# Altium footprint library mfmc_footprints.PcbLib: 156 footprints (part 9 of 10)
Each footprint in its own frame and in the unit in brackets; x right, y up, seen from the top. Pads: shape width x height; smd on the part's side, far side on the other; paste and mask are expansions set on the pad; w line width, h text height; cw(c..) or ccw(c..) is an arc to the next point about the centre after c.
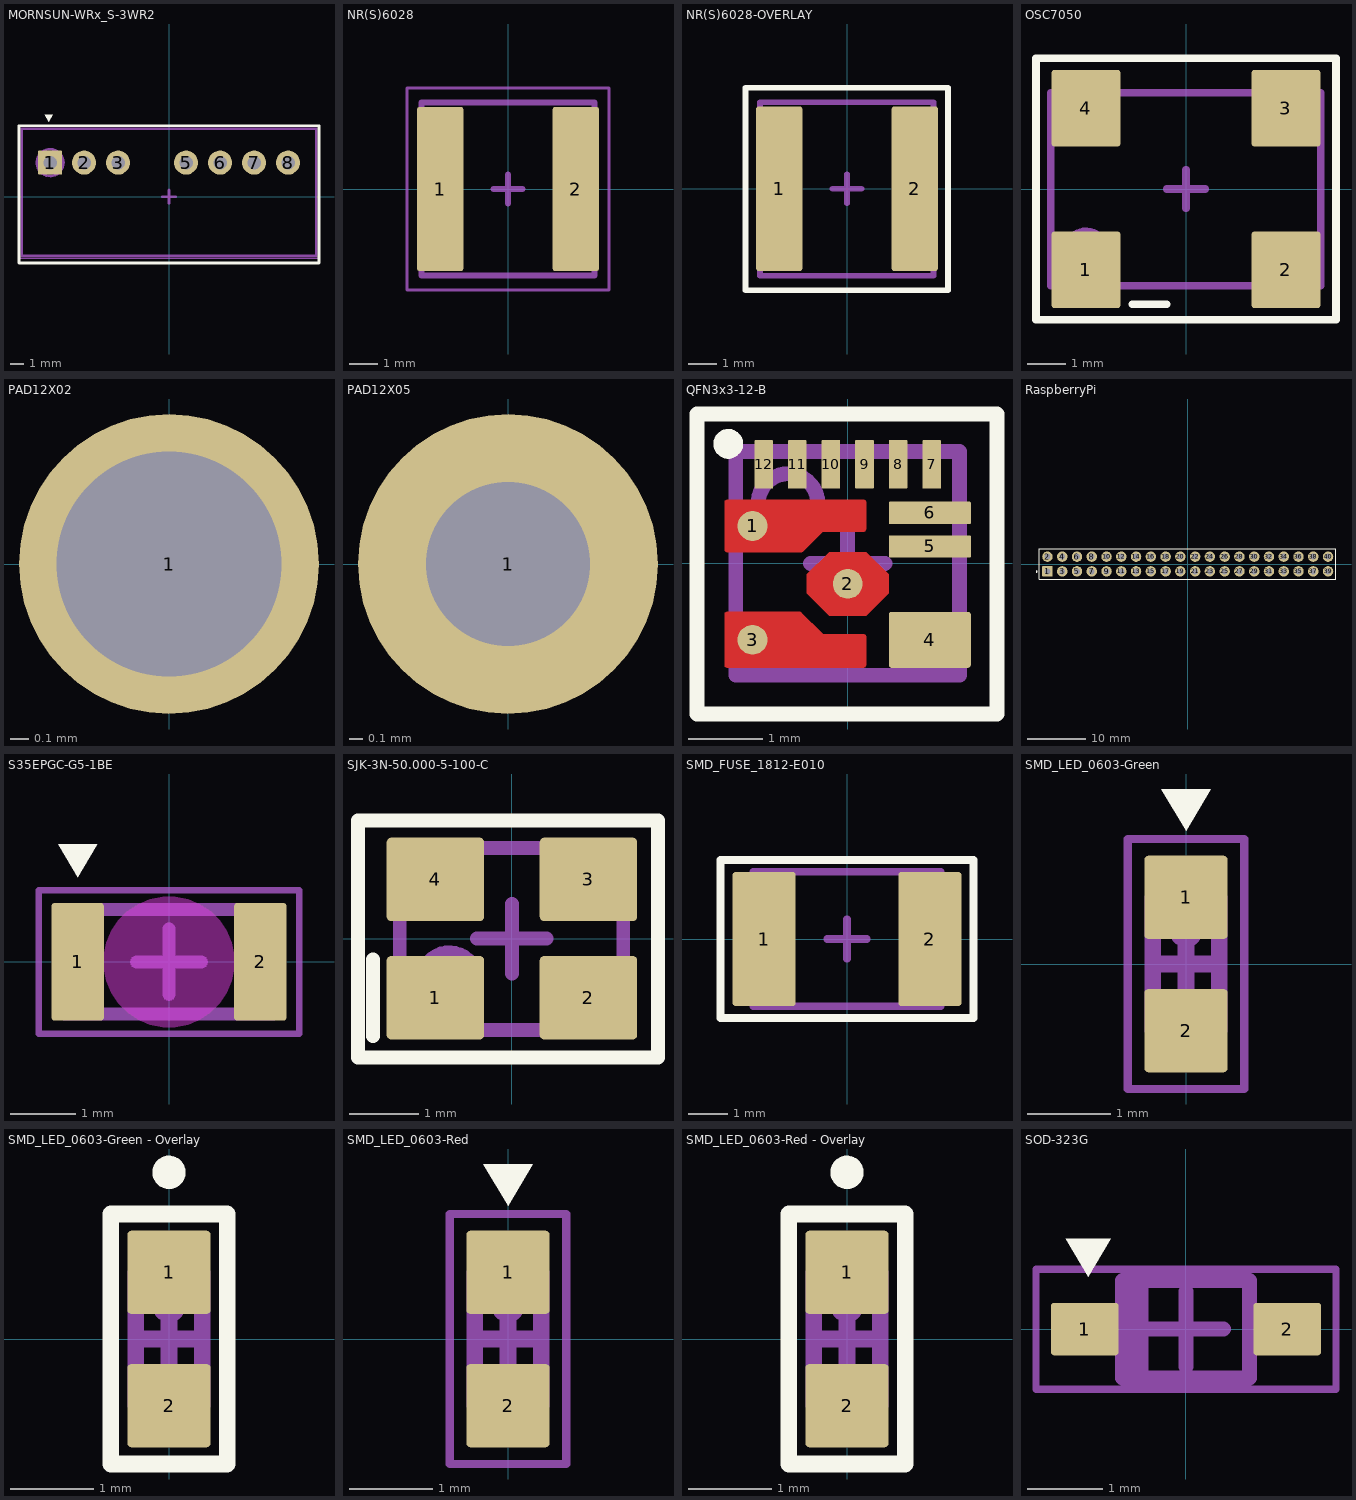
[diagram p8: the footprints below, top view; thin cyan lines are the x and y axes]

## MORNSUN-WRx_S-3WR2 [mm] "DC/DC Converter WRA_S-3WR2 & WRB_S-3WR2 Series"
height 12
pads (7):
  rrect10% 1.8x1.8 hole 1: 1(-8.89,2.54)
  round 1.8 hole 1: 2(-6.35,2.54) 3(-3.81,2.54) 5(1.27,2.54) 6(3.81,2.54) 7(6.35,2.54) 8(8.89,2.54)
Top Overlay:
  region: -9,5.6 -9.3,6.1 -9.2,6.1 -8.7,6.1
  lines w0.2: -11.213,-4.963 11.2,-4.963 11.2,5.3 -11.213,5.3 -11.213,-4.963
Top Courtyard:
  lines w0.1: -11.2,-4.6 -11.2,5.3 11.2,5.3 11.2,-4.6 -11.2,-4.6
  lines w0.2: -0.5,0 0.5,0 ; 0,-0.5 0,0.5
Top Assembly:
  circle w0.2: c-8.89,2.54 r1
  lines w0.2: -11,-4.42 -11,5.08 11,5.08 11,-4.42 -11,-4.42
Top Designator (Mech10):
  text ".Designator" at -7.624,0.011 h1.52
3D body "User Library-User Library-Power suply MORNSUN WRAxxxxS-3WR2.STEP": height 12, standoff -3.5, extent -11,-4.47 11,5.04

## NR(S)6028 [mm] "TAIYO YUDEN SMD POWER INDUCTORS 6x6x2.8mm"
height 2.8
pads (2):
  rrect10% 1.6x5.7 smd: 1(-2.35,0) 2(2.35,0)
Top Courtyard:
  lines w0.1: -3.5,-3.5 3.5,-3.5 3.5,3.5 -3.5,3.5 -3.5,-3.5
  lines w0.2: -0.5,0 0.5,0 ; 0,-0.5 0,0.5
Top Assembly:
  lines w0.2: -3,-3 3,-3 3,3 -3,3 -3,-3
Top Designator (Mech10):
  text ".Designator" at -7.618,-0.508 h1.52
3D body "User Library-NR6028T150M.step": height 2.81, standoff -0.05, extent -3,-3 3,3

## NR(S)6028-OVERLAY [mm] "TAIYO YUDEN SMD POWER INDUCTORS 6x6x2.8mm"
height 2.8
pads (2):
  rrect10% 1.6x5.7 smd: 1(-2.35,0) 2(2.35,0)
Top Overlay:
  lines w0.2: -3.519,-3.519 3.5,-3.519 3.5,3.5 -3.519,3.5 -3.519,-3.519
Top Courtyard:
  lines w0.1: -3.519,-3.519 3.5,-3.519 3.5,3.5 -3.519,3.5 -3.519,-3.519
  lines w0.2: -0.5,0 0.5,0 ; 0,-0.5 0,0.5
Top Assembly:
  lines w0.2: -3.019,-3.019 3,-3.019 3,3 -3.019,3 -3.019,-3.019
Top Designator (Mech10):
  text ".Designator" at -7.627,-0.517 h1.52
3D body "User Library-NR6028T150M.step": height 2.81, standoff -0.05, extent -3,-3 3,3

## OSC7050 [mm]
height 1.4
pads (4):
  rrect10% 1.8x2 smd: 1(-2.6,-2.1) 2(2.6,-2.1) 3(2.6,2.1) 4(-2.6,2.1)
Top Overlay:
  lines w0.2: -1.4,-3 -0.5,-3 ; -3.9,-3.4 -3.9,3.4 3.9,3.4 3.9,-3.4 -3.9,-3.4
Top Courtyard:
  lines w0.1: -3.9,-3.4 3.9,-3.4 3.9,3.4 -3.9,3.4 -3.9,-3.4
  lines w0.2: -0.5,0 0.5,0 ; 0,-0.5 0,0.5
Top Assembly:
  circle w0.2: c-2.6,-1.6 r0.5
  lines w0.2: -3.513,-2.513 3.5,-2.513 3.5,2.5 -3.513,2.5 -3.513,-2.513
Top Designator (Mech10):
  text ".Designator" at -7.618,-0.508 h1.52
3D body "OSC7050.STEP": height 1.4, standoff 0, extent -3.6,-2.6 3.6,2.6

## PAD12X02 [mm] "Pad -Hole = 1.2mm -Annular Ring = 0.2mm"
pads (1):
  round 1.6 hole 1.2: 1(0,0)
Top Designator (Mech10):
  text ".Designator" at -7.618,-0.508 h1.52

## PAD12X05 [mm] "Pad -Hole = 1.2mm -Annular Ring = 0.5mm"
pads (1):
  round 2.2 hole 1.2: 1(0,0)
Top Designator (Mech10):
  text ".Designator" at -7.618,-0.508 h1.52

## QFN3x3-12-B [mm]
height 0.9
pads (12):
  round 0.4 smd mask+0.04: 1(-1.275,0.5) 2(0,-0.275) 3(-1.275,-1.025)
  rrect10% 1.1x0.75 smd mask+0.04: 4(1.1,-1.025)
  rrect10% 1.1x0.3 smd mask+0.04: 5(1.1,0.225) 6(1.1,0.675)
  rrect10% 0.25x0.65 smd mask+0.04: 7(1.125,1.325) 8(0.675,1.325) 9(0.225,1.325) 10(-0.225,1.325) 11(-0.675,1.325) 12(-1.125,1.325)
Top Layer:
  region: -1.65,-0.685 -1.65,-1.365 -1.65,-1.372 -1.645,-1.385 -1.635,-1.395 -1.622,-1.4 -1.615,-1.4 0.21,-1.4 0.218,-1.4 0.233,-1.394 0.244,-1.383 0.25,-1.368 0.25,-1.36 0.25,-0.985 0.25,-0.978 0.245,-0.965 0.235,-0.955 0.222,-0.95 0.215,-0.95 -0.315,-0.95 -0.319,-0.95 -0.325,-0.948 -0.332,-0.946 -0.338,-0.942 -0.341,-0.939 -0.619,-0.661 -0.622,-0.658 -0.628,-0.654 -0.634,-0.651 -0.641,-0.65 -0.645,-0.65 -1.615,-0.65 -1.622,-0.65 -1.635,-0.655 -1.645,-0.665 -1.65,-0.678
  region: -1.65,0.185 -1.65,0.815 -1.65,0.822 -1.645,0.835 -1.635,0.845 -1.622,0.85 -1.615,0.85 0.215,0.85 0.222,0.85 0.235,0.845 0.245,0.835 0.25,0.822 0.25,0.815 0.25,0.46 0.25,0.453 0.245,0.44 0.235,0.43 0.222,0.425 0.215,0.425 -0.315,0.425 -0.319,0.425 -0.326,0.423 -0.332,0.421 -0.338,0.417 -0.341,0.414 -0.594,0.161 -0.597,0.158 -0.603,0.154 -0.609,0.151 -0.616,0.15 -0.62,0.15 -1.615,0.15 -1.622,0.15 -1.635,0.155 -1.645,0.165 -1.65,0.178
  region: -0.55,-0.15 -0.25,0.15 0.25,0.15 0.55,-0.15 0.55,-0.4 0.25,-0.699 -0.25,-0.699 -0.55,-0.4
Top Overlay:
  circle w0.2: c-1.6,1.6 r0.1
  lines w0.2: -2.019,-2.019 2,-2.019 2,2 -2.019,2 -2.019,-2.019
Top Courtyard:
  lines w0.1: -1.5,-1.5 -1.5,1.5 1.5,1.5 1.5,-1.5 -1.5,-1.5
  lines w0.2: -0.5,0 0.5,0 ; 0,-0.5 0,0.5
Top Assembly:
  circle w0.2: c-0.8,0.8 r0.4
  lines w0.2: -1.5,-1.5 -1.5,1.5 1.5,1.5 1.5,-1.5 -1.5,-1.5
Top Designator (Mech10):
  text ".Designator" at -7.627,-0.517 h1.52
3D body "SY8368A.STEP": height 0.95, standoff 0, extent -1.55,-1.5 1.55,1.55

## RaspberryPi [mm]
pads (40):
  rrect10% 1.8x1.8 hole 1.02: 1(-24.13,-1.27)
  round 1.8 hole 1.02: 2(-24.13,1.27) 3(-21.59,-1.27) 4(-21.59,1.27) 5(-19.05,-1.27) 6(-19.05,1.27) 7(-16.51,-1.27) 8(-16.51,1.27) 9(-13.97,-1.27) 10(-13.97,1.27) 11(-11.43,-1.27) 12(-11.43,1.27) 13(-8.89,-1.27) 14(-8.89,1.27) 15(-6.35,-1.27) 16(-6.35,1.27) 17(-3.81,-1.27) 18(-3.81,1.27) 19(-1.27,-1.27) 20(-1.27,1.27) 21(1.27,-1.27) 22(1.27,1.27) 23(3.81,-1.27) 24(3.81,1.27) 25(6.35,-1.27) 26(6.35,1.27) 27(8.89,-1.27) 28(8.89,1.27) 29(11.43,-1.27) 30(11.43,1.27) 31(13.97,-1.27) 32(13.97,1.27) 33(16.51,-1.27) 34(16.51,1.27) 35(19.05,-1.27) 36(19.05,1.27) 37(21.59,-1.27) 38(21.59,1.27) 39(24.13,-1.27) 40(24.13,1.27)
Top Overlay:
  circle w0.2: c-26,-1.3 r0.1
  lines w0.2: -25.5,-2.6 25.5,-2.6 25.5,2.6 -25.5,2.6 -25.5,-2.6
Top Designator (Mech10):
  text ".Designator" at 2.436,-25.485 h1.52
3D body "Raspberry Pi 3.STEP": height 15.49, standoff -3.1, extent -34.764,-53.633 54.872,3.678

## S35EPGC-G5-1BE [mm] "Reverse Package Chip LED Indicator"
height 0.3
pads (2):
  rrect10% 0.8x1.8 smd: 1(-1.4,0) 2(1.4,0)
Top Overlay:
  region: -1.7,1.8 -1.4,1.3 -1.1,1.8
Keep-Out Layer:
  board cut-out: 0,-1 -0.098,-1 -0.292,-0.962 -0.474,-0.886 -0.637,-0.777 -0.777,-0.637 -0.886,-0.474 -0.962,-0.292 -1,-0.098 -1,0 -1,0.098 -0.962,0.292 -0.886,0.474 -0.777,0.637 -0.637,0.777 -0.474,0.886 -0.292,0.962 -0.098,1 0,1 0.098,1 0.292,0.962 0.474,0.886 0.637,0.777 0.777,0.637 0.886,0.474 0.962,0.292 1,0.098 1,0 1,-0.098 0.962,-0.292 0.886,-0.474 0.777,-0.637 0.637,-0.777 0.474,-0.886 0.292,-0.962 0.098,-1
Top Courtyard:
  lines w0.1: -2,-1.1 2,-1.1 2,1.1 -2,1.1 -2,-1.1
  lines w0.2: -0.5,0 0.5,0 ; 0,-0.5 0,0.5
Top Assembly:
  rectangle: -1.6,-0.8 -1.2,0.8
  lines w0.2: -1.6,-0.8 1.6,-0.8 1.6,0.8 -1.6,0.8 -1.6,-0.8
Top Designator (Mech10):
  text ".Designator" at -7.618,-0.183 h1.52

## SJK-3N-50.000-5-100-C [mm]
height 1
pads (4):
  rrect10% 1.4x1.2 smd: 1(-1.1,-0.85) 2(1.1,-0.85) 3(1.1,0.85) 4(-1.1,0.85)
Top Overlay:
  lines w0.2: -2,-1.4 -2,-0.3 ; -2.213,-1.713 2.1,-1.713 2.1,1.7 -2.213,1.7 -2.213,-1.713
Top Courtyard:
  lines w0.1: -2.213,-1.713 2.1,-1.713 2.1,1.7 -2.213,1.7 -2.213,-1.713
  lines w0.2: -0.5,0 0.5,0 ; 0,-0.5 0,0.5
Top Assembly:
  circle w0.2: c-0.9,-0.6 r0.4
  lines w0.2: -1.613,-1.313 1.6,-1.313 1.6,1.3 -1.613,1.3 -1.613,-1.313
Top Designator (Mech10):
  text ".Designator" at -7.674,-0.514 h1.52
3D body "User Library-Ecsxtal__ECS-3225MV__Body3_2x2_5__H1_2.step": height 1, standoff 0, extent -1.6,-1.25 1.6,1.25

## SMD_FUSE_1812-E010 [mm]
height 0.9
pads (2):
  rrect10% 1.6x3.4 smd: 1(-2.1,0) 2(2.1,0)
Top Overlay:
  lines w0.2: -3.2,-2 3.2,-2 3.2,2 -3.2,2 -3.2,-2
Top Courtyard:
  lines w0.1: -3.2,-2 -3.2,2 3.2,2 3.2,-2 -3.2,-2
  lines w0.2: -0.5,0 0.5,0 ; 0,-0.5 0,0.5
Top Assembly:
  lines w0.2: -2.365,-1.705 2.365,-1.705 2.365,1.705 -2.365,1.705 -2.365,-1.705
Top Designator (Mech10):
  text ".Designator" at -7.618,-0.508 h1.52
3D body "SR1812-Body.STEP": height 0.9, standoff 0, extent -2.25,-1.6 2.25,1.6

## SMD_LED_0603-Green [mm]
pads (2):
  rrect10% 1x1 smd: 1(0,0.8) 2(0,-0.8)
Top Overlay:
  region: 0,1.6 -0.3,2.1 0.3,2.1
Top Courtyard:
  lines w0.1: -0.7,-1.5 0.7,-1.5 0.7,1.5 -0.7,1.5 -0.7,-1.5
  lines w0.2: -0.3,0 0.3,0 ; 0,-0.3 0,0.3
Top Assembly:
  circle w0.2: c0,0.4 r0.1
  lines w0.2: -0.4,-0.8 0.4,-0.8 0.4,0.8 -0.4,0.8 -0.4,-0.8
Top Designator (Mech10):
  text ".Designator" at -7.618,-0.208 h1.52
3D body "SMD_LED_0603-Green.STEP": height 0.68, standoff 0, extent -0.368,-0.825 0.357,0.825

## SMD_LED_0603-Green - Overlay [mm]
pads (2):
  rrect10% 1x1 smd: 1(0,0.8) 2(0,-0.8)
Top Overlay:
  circle w0.2: c0,2 r0.1
  lines w0.2: -0.7,-1.5 0.7,-1.5 0.7,1.5 -0.7,1.5 -0.7,-1.5
Top Courtyard:
  lines w0.1: -0.7,-1.5 -0.7,1.5 0.7,1.5 0.7,-1.5 -0.7,-1.5
  lines w0.2: -0.3,0 0.3,0 ; 0,-0.3 0,0.3
Top Assembly:
  circle w0.2: c0,0.4 r0.1
  lines w0.2: -0.4,-0.8 -0.4,0.8 0.4,0.8 0.4,-0.8 -0.4,-0.8
Top Designator (Mech10):
  text ".Designator" at -7.618,-0.208 h1.52
3D body "SMD_LED_0603-Green.STEP": height 0.68, standoff 0, extent -0.368,-0.825 0.357,0.825

## SMD_LED_0603-Red [mm]
pads (2):
  rrect10% 1x1 smd: 1(0,0.8) 2(0,-0.8)
Top Overlay:
  region: 0,1.6 -0.3,2.1 0.3,2.1
Top Courtyard:
  lines w0.1: -0.7,-1.5 0.7,-1.5 0.7,1.5 -0.7,1.5 -0.7,-1.5
  lines w0.2: -0.3,0 0.3,0 ; 0,-0.3 0,0.3
Top Assembly:
  circle w0.2: c0,0.4 r0.1
  lines w0.2: -0.4,-0.8 0.4,-0.8 0.4,0.8 -0.4,0.8 -0.4,-0.8
Top Designator (Mech10):
  text ".Designator" at -7.618,-0.208 h1.52
3D body "SMD_LED_0603-Red.STEP": height 0.68, standoff 0, extent -0.368,-0.825 0.357,0.825

## SMD_LED_0603-Red - Overlay [mm]
pads (2):
  rrect10% 1x1 smd: 1(0,0.8) 2(0,-0.8)
Top Overlay:
  circle w0.2: c0,2 r0.1
  lines w0.2: -0.7,-1.5 -0.7,1.5 0.7,1.5 0.7,-1.5 -0.7,-1.5
Top Courtyard:
  lines w0.1: -0.7,-1.5 0.7,-1.5 0.7,1.5 -0.7,1.5 -0.7,-1.5
  lines w0.2: -0.3,0 0.3,0 ; 0,-0.3 0,0.3
Top Assembly:
  circle w0.2: c0,0.4 r0.1
  lines w0.2: -0.4,-0.8 0.4,-0.8 0.4,0.8 -0.4,0.8 -0.4,-0.8
Top Designator (Mech10):
  text ".Designator" at -7.618,-0.208 h1.52
3D body "SMD_LED_0603-Red.STEP": height 0.68, standoff 0, extent -0.368,-0.825 0.357,0.825

## SOD-323G [mm] "Small Outline Diode"
height 1
pads (2):
  rrect10% 0.9x0.7 smd: 1(-1.35,0) 2(1.35,0)
Top Overlay:
  region: -1.3,0.7 -1.6,1.2 -1,1.2
Top Courtyard:
  lines w0.1: -2,-0.8 2,-0.8 2,0.8 -2,0.8 -2,-0.8
  lines w0.2: -0.5,0 0.5,0 ; 0,-0.5 0,0.5
Top Assembly:
  rectangle: -0.9,-0.65 -0.5,0.65
  lines w0.2: -0.85,-0.65 -0.85,0.65 0.85,0.65 0.85,-0.65 -0.85,-0.65
Top Designator (Mech10):
  text ".Designator" at -7.624,-0.339 h1.52
3D body "User Library-SOD323-1.step": height 1.1, standoff 0, extent -1.3,-0.675 1.3,0.675